# Altium footprint library 3M THD.PcbLib: 163 footprints (part 6 of 14)
Each footprint in its own frame and in the unit in brackets; x right, y up, seen from the top. Pads: shape width x height; smd on the part's side, far side on the other; paste and mask are expansions set on the pad; w line width, h text height; cw(c..) or ccw(c..) is an arc to the next point about the centre after c.
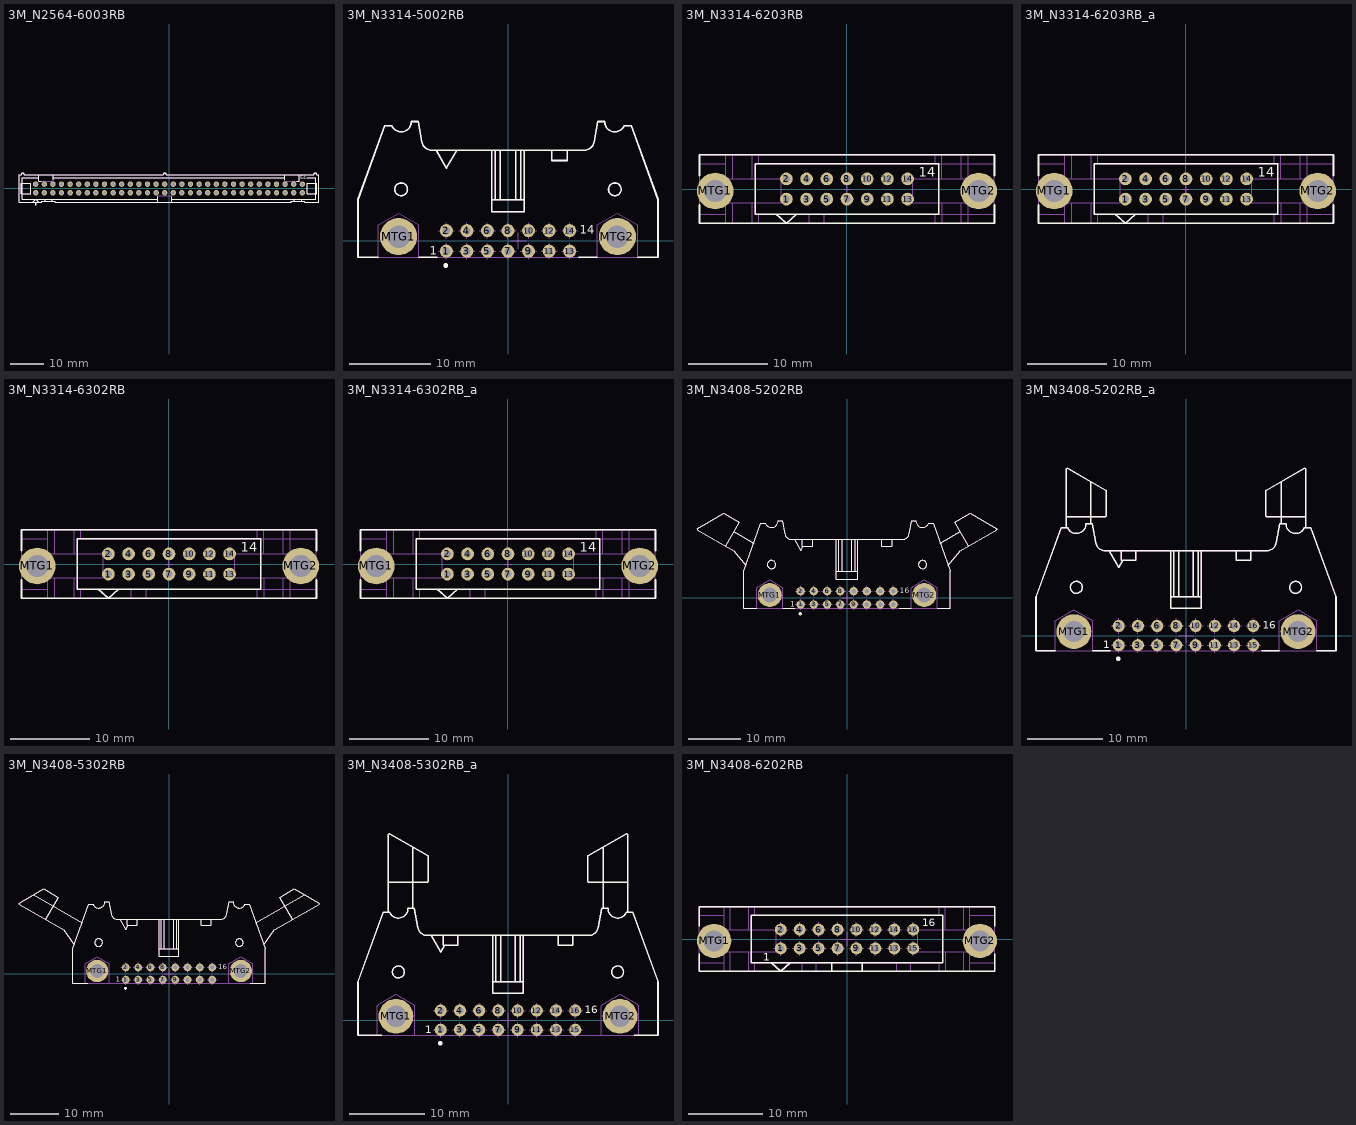
[diagram p5: the footprints below, top view; thin cyan lines are the x and y axes]

## 3M_N2564-6003RB [mm] "64 Contacts - Straight .100\" x .100\" Low Profile Four-Wall Header"
height 9.91
pads (64):
  round 1.6 hole 1: 1(-39.37,-1.27) 2(-39.37,1.27) 3(-36.83,-1.27) 4(-36.83,1.27) 5(-34.29,-1.27) 6(-34.29,1.27) 7(-31.75,-1.27) 8(-31.75,1.27) 9(-29.21,-1.27) 10(-29.21,1.27) 11(-26.67,-1.27) 12(-26.67,1.27) 13(-24.13,-1.27) 14(-24.13,1.27) 15(-21.59,-1.27) 16(-21.59,1.27) 17(-19.05,-1.27) 18(-19.05,1.27) 19(-16.51,-1.27) 20(-16.51,1.27) 21(-13.97,-1.27) 22(-13.97,1.27) 23(-11.43,-1.27) 24(-11.43,1.27) 25(-8.89,-1.27) 26(-8.89,1.27) 27(-6.35,-1.27) 28(-6.35,1.27) 29(-3.81,-1.27) 30(-3.81,1.27) 31(-1.27,-1.27) 32(-1.27,1.27) 33(1.27,-1.27) 34(1.27,1.27) 35(3.81,-1.27) 36(3.81,1.27) 37(6.35,-1.27) 38(6.35,1.27) 39(8.89,-1.27) 40(8.89,1.27) 41(11.43,-1.27) 42(11.43,1.27) 43(13.97,-1.27) 44(13.97,1.27) 45(16.51,-1.27) 46(16.51,1.27) 47(19.05,-1.27) 48(19.05,1.27) 49(21.59,-1.27) 50(21.59,1.27) 51(24.13,-1.27) 52(24.13,1.27) 53(26.67,-1.27) 54(26.67,1.27) 55(29.21,-1.27) 56(29.21,1.27) 57(31.75,-1.27) 58(31.75,1.27) 59(34.29,-1.27) 60(34.29,1.27) 61(36.83,-1.27) 62(36.83,1.27) 63(39.37,-1.27) 64(39.37,1.27)
Top Overlay:
  circle w0.3: c-39.37,-4.699 r0.15
  lines w0.2: -43.282,-1.603 -40.869,-1.603 -40.869,1.603 -43.282,1.603 ; -43.282,-1.524 -43.586,-1.524 -43.586,1.524 -43.282,1.524 ; -40.234,-4.064 -39.37,-3.2 -38.506,-4.064 ; -38.418,3.15 -43.282,3.15 -43.282,-3.2 -3.366,-3.2 ; -38.418,4.064 -38.418,2.159 -37.709,2.159 ; -36.601,-3.835 -36.601,-3.2 ; -34.519,-3.835 -34.519,-3.2 ; -34.227,2.518 -34.227,4.064 ; -34.227,3.15 34.227,3.15 ; -3.366,-4.064 -3.366,-2.438 ; 0.826,-4.064 0.826,-2.438 ; 0.826,-3.2 43.282,-3.2 43.282,3.15 40.64,3.15 ; 34.227,2.518 34.227,4.064 ; 37.059,-3.835 37.059,-3.2 ; 37.709,2.159 38.418,2.159 38.418,4.064 ; 39.141,-3.835 39.141,-3.2 ; 43.282,-1.603 40.869,-1.603 40.869,1.603 43.282,1.603 ; 43.282,-1.524 43.586,-1.524 43.586,1.524 43.282,1.524 ; -44.298,-4.064 -44.298,4.064 -43.637,4.064 cw(c-43.18,4.064) -42.723,4.064 -1.727,4.064 cw(c-1.27,4.064) -0.813,4.064 42.723,4.064 cw(c43.18,4.064) 43.637,4.064 44.298,4.064 44.298,-4.064 40.132,-4.064 40.132,-3.835 36.068,-3.835 36.068,-4.064 -33.528,-4.064 -33.528,-3.835 -37.592,-3.835 -37.592,-4.064 -44.298,-4.064
  text "64" at 38.735,2.667 h1.02
Mechanical 14:
  lines w0.1: -43.282,-1.603 -40.869,-1.603 -40.869,1.603 -43.282,1.603 ; -43.282,-1.524 -43.586,-1.524 -43.586,1.524 -43.282,1.524 ; -40.234,-4.064 -39.37,-3.2 -38.506,-4.064 ; -38.418,3.15 -43.282,3.15 -43.282,-3.2 -3.366,-3.2 ; -38.418,4.064 -38.418,2.159 -34.227,2.159 -34.227,4.064 ; -36.601,-3.835 -36.601,-3.2 ; -34.519,-3.835 -34.519,-3.2 ; -34.227,3.15 34.227,3.15 ; -3.366,-4.064 -3.366,-2.159 0.826,-2.159 0.826,-4.064 ; 0.826,-3.2 43.282,-3.2 43.282,3.15 40.64,3.15 ; 34.227,4.064 34.227,2.159 38.418,2.159 38.418,4.064 ; 37.059,-3.835 37.059,-3.2 ; 39.141,-3.835 39.141,-3.2 ; 43.282,-1.603 40.869,-1.603 40.869,1.603 43.282,1.603 ; 43.282,-1.524 43.586,-1.524 43.586,1.524 43.282,1.524 ; -44.298,-4.064 -44.298,4.064 -43.637,4.064 cw(c-43.18,4.064) -42.723,4.064 -1.727,4.064 cw(c-1.27,4.064) -0.813,4.064 42.723,4.064 cw(c43.18,4.064) 43.637,4.064 44.298,4.064 44.298,-4.064 40.132,-4.064 40.132,-3.835 36.068,-3.835 36.068,-4.064 -33.528,-4.064 -33.528,-3.835 -37.592,-3.835 -37.592,-4.064 -44.298,-4.064
  text "64" at 38.735,2.667 h1.02
3D body "3M_N2564-6003RB.stp": height 9.91, standoff -3.94, extent -44.297,-4.115 44.298,4.521

## 3M_N3314-5002RB [mm] "3M, 3000 Series, 14 Contacts - Pitch 2.54mm - Right Angle Four-Wall Header (Black) Without Roll Pin Latch/Ejectors"
height 8.6
pads (16):
  round 1.6 hole 0.9: 1(-7.62,-1.27) 2(-7.62,1.27) 3(-5.08,-1.27) 4(-5.08,1.27) 5(-2.54,-1.27) 6(-2.54,1.27) 7(0,-1.27) 8(0,1.27) 9(2.54,-1.27) 10(2.54,1.27) 11(5.08,-1.27) 12(5.08,1.27) 13(7.62,-1.27) 14(7.62,1.27)
  round 4.6 hole 2.8: MTG1(-13.526,0.533) MTG2(13.526,0.533)
Top Overlay:
  circle w0.2: c13.208,6.375 r0.787
  circle w0.2: c-13.208,6.375 r0.787
  circle w0.3: c-7.693,-3.048 r0.15
  lines w0.2: -16.027,-2.007 -18.542,-2.007 -18.542,5.105 -15.214,14.249 -14.372,14.249 ccw(c-13.208,14.757) -11.938,14.757 -11.096,14.757 -10.654,12.251 ccw(c-9.403,12.471) -9.403,11.201 9.403,11.201 ccw(c9.403,12.471) 10.654,12.251 11.096,14.757 11.938,14.757 ccw(c13.208,14.757) 14.372,14.249 15.214,14.249 18.542,5.105 18.542,-2.007 16.027,-2.007 ; -11.024,-2.007 -8.73,-2.007 ; -8.884,11.201 -7.614,9.002 ; -7.605,9 -6.335,11.2 ; -2.032,5.105 2.032,5.105 ; -2.032,11.201 -2.032,3.581 2.032,3.581 2.032,11.201 ; -1.587,5.105 -1.587,11.201 ; -0.953,5.105 -0.953,11.201 ; 0.953,5.105 0.953,11.201 ; 1.587,5.105 1.587,11.201 ; 5.398,11.201 5.391,9.931 7.309,9.931 7.303,11.201 ; 8.73,-2.007 11.024,-2.007
  text "1" at -9.652,-1.7 h1.02
  text "14" at 8.88,0.889 h1.02
Mechanical 8:
  lines w0.1: -14.526,0.533 -13.526,0.533 ; -13.526,-0.467 -13.526,0.533 ; -13.526,1.533 -13.526,0.533 ; -12.526,0.533 -13.526,0.533 ; -8.62,-1.27 -7.62,-1.27 ; -8.62,1.27 -7.62,1.27 ; -7.62,-2.27 -7.62,-1.27 ; -7.62,-0.27 -7.62,-1.27 ; -7.62,0.27 -7.62,1.27 ; -7.62,2.27 -7.62,1.27 ; -6.62,-1.27 -7.62,-1.27 ; -6.62,1.27 -7.62,1.27 ; -6.08,-1.27 -5.08,-1.27 ; -6.08,1.27 -5.08,1.27 ; -5.08,-2.27 -5.08,-1.27 ; -5.08,-0.27 -5.08,-1.27 ; -5.08,0.27 -5.08,1.27 ; -5.08,2.27 -5.08,1.27 ; -4.08,-1.27 -5.08,-1.27 ; -4.08,1.27 -5.08,1.27 ; -3.54,-1.27 -2.54,-1.27 ; -3.54,1.27 -2.54,1.27 ; -2.54,-2.27 -2.54,-1.27 ; -2.54,-0.27 -2.54,-1.27 ; -2.54,0.27 -2.54,1.27 ; -2.54,2.27 -2.54,1.27 ; -1.54,-1.27 -2.54,-1.27 ; -1.54,1.27 -2.54,1.27 ; -1,-1.27 0,-1.27 ; -1,1.27 0,1.27 ; 0,-2.27 0,-1.27 ; 0,-0.27 0,-1.27 ; 0,0.27 0,1.27 ; 0,2.27 0,1.27 ; 0.27,0 1.27,0 ; 1,-1.27 0,-1.27 ; 1,1.27 0,1.27 ; 1.27,-1 1.27,0 ; 1.27,1 1.27,0 ; 1.54,-1.27 2.54,-1.27 ; 1.54,1.27 2.54,1.27 ; 2.27,0 1.27,0 ; 2.54,-2.27 2.54,-1.27 ; 2.54,-0.27 2.54,-1.27 ; 2.54,0.27 2.54,1.27 ; 2.54,2.27 2.54,1.27 ; 3.54,-1.27 2.54,-1.27 ; 3.54,1.27 2.54,1.27 ; 4.08,-1.27 5.08,-1.27 ; 4.08,1.27 5.08,1.27 ; 5.08,-2.27 5.08,-1.27 ; 5.08,-0.27 5.08,-1.27 ; 5.08,0.27 5.08,1.27 ; 5.08,2.27 5.08,1.27 ; 6.08,-1.27 5.08,-1.27 ; 6.08,1.27 5.08,1.27 ; 6.62,-1.27 7.62,-1.27 ; 6.62,1.27 7.62,1.27 ; 7.62,-2.27 7.62,-1.27 ; 7.62,-0.27 7.62,-1.27 ; 7.62,0.27 7.62,1.27 ; 7.62,2.27 7.62,1.27 ; 8.62,-1.27 7.62,-1.27 ; 8.62,1.27 7.62,1.27 ; 12.526,0.533 13.526,0.533 ; 13.526,-0.467 13.526,0.533 ; 13.526,1.533 13.526,0.533 ; 14.526,0.533 13.526,0.533
Mechanical 14:
  circle w0.1: c-13.526,0.533 r1.27
  circle w0.1: c13.526,0.533 r1.27
  circle w0.1: c13.208,6.375 r0.787
  circle w0.1: c-13.208,6.375 r0.787
  lines w0.1: -16.027,-2.007 -16.027,1.978 -13.526,3.422 -11.024,1.978 -11.024,-2.007 ; -8.884,11.201 -7.614,9.002 -6.344,11.201 ; -2.032,5.105 2.032,5.105 ; -2.032,11.201 -2.032,3.581 2.032,3.581 2.032,11.201 ; -1.587,5.105 -1.587,11.201 ; -0.953,5.105 -0.953,11.201 ; 0.953,5.105 0.953,11.201 ; 1.587,5.105 1.587,11.201 ; 5.398,11.201 5.391,9.931 7.309,9.931 7.303,11.201 ; 11.024,-2.007 11.024,1.978 13.526,3.422 16.027,1.978 16.027,-2.007 ; -18.542,-2.007 18.542,-2.007 18.542,5.105 15.214,14.249 14.372,14.249 cw(c13.208,14.757) 11.938,14.757 11.096,14.757 10.654,12.251 cw(c9.403,12.471) 9.403,11.201 -9.403,11.201 cw(c-9.403,12.471) -10.654,12.251 -11.096,14.757 -11.938,14.757 cw(c-13.208,14.757) -14.372,14.249 -15.214,14.249 -18.542,5.105 -18.542,-2.007
  text "1" at -9.652,-1.7 h1.02
  text "14" at 8.88,0.889 h1.02
3D body "3M_N3314-5002RB.stp": height 8.64, standoff -2.84, extent -18.542,-2.514 18.542,14.758

## 3M_N3314-6203RB [mm] "14 Contacts - Straight .100'' x .100'' Low Profile Black Four-Wall Header (Short Roll Pin Latch/Ejectors), (Solder Tail 3.94mm), 3000 Series"
height 24.6
pads (16):
  round 1.6 hole 0.9: 1(-7.62,-1.27) 2(-7.62,1.27) 3(-5.08,-1.27) 4(-5.08,1.27) 5(-2.54,-1.27) 6(-2.54,1.27) 7(0,-1.27) 8(0,1.27) 9(2.54,-1.27) 10(2.54,1.27) 11(5.08,-1.27) 12(5.08,1.27) 13(7.62,-1.27) 14(7.62,1.27)
  round 4.6 hole 2.8: MTG1(-16.56,-0.25) MTG2(16.56,-0.25)
Top Overlay:
  lines w0.2: -18.542,-2 -18.542,-4.318 18.542,-4.318 18.542,-2 ; -18.542,1.7 -18.542,4.3 ; -18.542,4.318 18.542,4.318 ; 18.542,1.7 18.542,4.3 ; -11.557,-3.175 11.557,-3.175 11.557,3.175 -11.557,3.175 -11.557,-3.175 ; -8.89,-3.175 -6.35,-3.175 -7.62,-4.318 -8.89,-3.175
  text "14" at 9.05,1.525 h1.2
Mechanical 8:
  lines w0.1: -17.06,-0.25 -16.56,-0.25 ; -16.56,-0.75 -16.56,-0.25 ; -16.56,0.25 -16.56,-0.25 ; -16.06,-0.25 -16.56,-0.25 ; -8.12,-1.27 -7.62,-1.27 ; -8.12,1.27 -7.62,1.27 ; -7.62,-1.77 -7.62,-1.27 ; -7.62,-0.77 -7.62,-1.27 ; -7.62,0.77 -7.62,1.27 ; -7.62,1.77 -7.62,1.27 ; -7.12,-1.27 -7.62,-1.27 ; -7.12,1.27 -7.62,1.27 ; -5.58,-1.27 -5.08,-1.27 ; -5.58,1.27 -5.08,1.27 ; -5.08,-1.77 -5.08,-1.27 ; -5.08,-0.77 -5.08,-1.27 ; -5.08,0.77 -5.08,1.27 ; -5.08,1.77 -5.08,1.27 ; -4.58,-1.27 -5.08,-1.27 ; -4.58,1.27 -5.08,1.27 ; -3.04,-1.27 -2.54,-1.27 ; -3.04,1.27 -2.54,1.27 ; -2.54,-1.77 -2.54,-1.27 ; -2.54,-0.77 -2.54,-1.27 ; -2.54,0.77 -2.54,1.27 ; -2.54,1.77 -2.54,1.27 ; -2.04,-1.27 -2.54,-1.27 ; -2.04,1.27 -2.54,1.27 ; -0.5,-1.27 0,-1.27 ; -0.5,0 0,0 ; -0.5,1.27 0,1.27 ; 0,-1.77 0,-1.27 ; 0,-0.77 0,-1.27 ; 0,-0.5 0,0 ; 0,0.5 0,0 ; 0,0.77 0,1.27 ; 0,1.77 0,1.27 ; 0.5,-1.27 0,-1.27 ; 0.5,0 0,0 ; 0.5,1.27 0,1.27 ; 2.04,-1.27 2.54,-1.27 ; 2.04,1.27 2.54,1.27 ; 2.54,-1.77 2.54,-1.27 ; 2.54,-0.77 2.54,-1.27 ; 2.54,0.77 2.54,1.27 ; 2.54,1.77 2.54,1.27 ; 3.04,-1.27 2.54,-1.27 ; 3.04,1.27 2.54,1.27 ; 4.58,-1.27 5.08,-1.27 ; 4.58,1.27 5.08,1.27 ; 5.08,-1.77 5.08,-1.27 ; 5.08,-0.77 5.08,-1.27 ; 5.08,0.77 5.08,1.27 ; 5.08,1.77 5.08,1.27 ; 5.58,-1.27 5.08,-1.27 ; 5.58,1.27 5.08,1.27 ; 7.12,-1.27 7.62,-1.27 ; 7.12,1.27 7.62,1.27 ; 7.62,-1.77 7.62,-1.27 ; 7.62,-0.77 7.62,-1.27 ; 7.62,0.77 7.62,1.27 ; 7.62,1.77 7.62,1.27 ; 8.12,-1.27 7.62,-1.27 ; 8.12,1.27 7.62,1.27 ; 16.06,-0.25 16.56,-0.25 ; 16.56,-0.75 16.56,-0.25 ; 16.56,0.25 16.56,-0.25 ; 17.06,-0.25 16.56,-0.25
Mechanical 14:
  circle w0.1: c16.574,-0.254 r1.27
  circle w0.1: c-16.573,-0.254 r1.27
  lines w0.1: -18.542,-3.175 -15.214,-3.175 ; -15.214,-4.318 -15.214,-1.727 -8.255,-1.727 -8.255,1.27 -15.214,1.27 -15.214,4.318 ; -14.372,-4.318 -14.372,-1.727 ; -14.372,1.27 -14.372,4.318 ; -11.939,-4.318 -11.938,-1.727 ; -11.557,-1.727 -11.557,-3.175 18.542,-3.175 15.214,-3.175 ; -11.557,1.27 -11.557,3.175 18.542,3.175 15.214,3.175 ; -4.769,-4.318 -4.769,-3.175 ; -2.851,-4.318 -2.851,-3.175 ; 11.096,-4.318 11.096,-3.175 ; 11.096,3.175 11.096,4.318 ; 11.557,-3.175 11.557,-1.727 ; 11.557,1.27 11.557,3.175 ; 11.938,1.27 11.938,4.318 ; 11.979,-4.318 11.979,-1.727 ; 14.372,-4.318 14.372,-1.727 ; 14.372,1.27 14.372,4.318 ; 15.214,-4.318 15.214,-1.727 8.255,-1.727 8.255,1.27 15.214,1.27 15.214,4.318 ; -18.542,-4.318 -18.542,4.318 18.542,4.318 18.542,-4.318 -18.542,-4.318 ; -18.542,3.175 -15.214,3.175 -18.542,3.175 ; -18.097,-1.134 -16.573,-2.014 -15.049,-1.134 -15.049,0.626 -16.573,1.506 -18.097,0.626 -18.097,-1.134 ; -11.938,1.27 -11.938,4.318 -11.938,1.27 ; -11.096,-4.318 -11.096,-3.175 -11.096,-4.318 ; -11.096,3.175 -11.096,4.318 -11.096,3.175 ; -8.89,-3.175 -6.35,-3.175 -7.62,-4.318 -8.89,-3.175 ; 15.05,-1.134 16.574,-2.014 18.098,-1.134 18.098,0.626 16.574,1.506 15.05,0.626 15.05,-1.134
  text "14" at 9.05,1.525 h1.2
3D body "3M_N3314-6203RB.stp": height 18.69, standoff -3.94, extent -27.471,-4.318 27.471,4.318

## 3M_N3314-6203RB_a [mm] "14 Contacts - Straight .100'' x .100'' Low Profile Black Four-Wall Header (Short Roll Pin Latch/Ejectors), (Solder Tail 3.94mm), 3000 Series"
height 24.6
pads (16):
  round 1.6 hole 0.9: 1(-7.62,-1.27) 2(-7.62,1.27) 3(-5.08,-1.27) 4(-5.08,1.27) 5(-2.54,-1.27) 6(-2.54,1.27) 7(0,-1.27) 8(0,1.27) 9(2.54,-1.27) 10(2.54,1.27) 11(5.08,-1.27) 12(5.08,1.27) 13(7.62,-1.27) 14(7.62,1.27)
  round 4.6 hole 2.8: MTG1(-16.56,-0.25) MTG2(16.56,-0.25)
Top Overlay:
  lines w0.2: -18.542,-2 -18.542,-4.318 18.542,-4.318 18.542,-2 ; -18.542,1.7 -18.542,4.3 ; -18.542,4.318 18.542,4.318 ; 18.542,1.7 18.542,4.3 ; -11.557,-3.175 -11.557,3.175 11.557,3.175 11.557,-3.175 -11.557,-3.175 ; -8.89,-3.175 -7.62,-4.318 -6.35,-3.175 -8.89,-3.175
  text "14" at 9.05,1.525 h1.2
Mechanical 8:
  lines w0.1: -17.06,-0.25 -16.56,-0.25 ; -16.56,-0.75 -16.56,-0.25 ; -16.56,0.25 -16.56,-0.25 ; -16.06,-0.25 -16.56,-0.25 ; -8.12,-1.27 -7.62,-1.27 ; -8.12,1.27 -7.62,1.27 ; -7.62,-1.77 -7.62,-1.27 ; -7.62,-0.77 -7.62,-1.27 ; -7.62,0.77 -7.62,1.27 ; -7.62,1.77 -7.62,1.27 ; -7.12,-1.27 -7.62,-1.27 ; -7.12,1.27 -7.62,1.27 ; -5.58,-1.27 -5.08,-1.27 ; -5.58,1.27 -5.08,1.27 ; -5.08,-1.77 -5.08,-1.27 ; -5.08,-0.77 -5.08,-1.27 ; -5.08,0.77 -5.08,1.27 ; -5.08,1.77 -5.08,1.27 ; -4.58,-1.27 -5.08,-1.27 ; -4.58,1.27 -5.08,1.27 ; -3.04,-1.27 -2.54,-1.27 ; -3.04,1.27 -2.54,1.27 ; -2.54,-1.77 -2.54,-1.27 ; -2.54,-0.77 -2.54,-1.27 ; -2.54,0.77 -2.54,1.27 ; -2.54,1.77 -2.54,1.27 ; -2.04,-1.27 -2.54,-1.27 ; -2.04,1.27 -2.54,1.27 ; -0.5,-1.27 0,-1.27 ; -0.5,0 0,0 ; -0.5,1.27 0,1.27 ; 0,-1.77 0,-1.27 ; 0,-0.77 0,-1.27 ; 0,-0.5 0,0 ; 0,0.5 0,0 ; 0,0.77 0,1.27 ; 0,1.77 0,1.27 ; 0.5,-1.27 0,-1.27 ; 0.5,0 0,0 ; 0.5,1.27 0,1.27 ; 2.04,-1.27 2.54,-1.27 ; 2.04,1.27 2.54,1.27 ; 2.54,-1.77 2.54,-1.27 ; 2.54,-0.77 2.54,-1.27 ; 2.54,0.77 2.54,1.27 ; 2.54,1.77 2.54,1.27 ; 3.04,-1.27 2.54,-1.27 ; 3.04,1.27 2.54,1.27 ; 4.58,-1.27 5.08,-1.27 ; 4.58,1.27 5.08,1.27 ; 5.08,-1.77 5.08,-1.27 ; 5.08,-0.77 5.08,-1.27 ; 5.08,0.77 5.08,1.27 ; 5.08,1.77 5.08,1.27 ; 5.58,-1.27 5.08,-1.27 ; 5.58,1.27 5.08,1.27 ; 7.12,-1.27 7.62,-1.27 ; 7.12,1.27 7.62,1.27 ; 7.62,-1.77 7.62,-1.27 ; 7.62,-0.77 7.62,-1.27 ; 7.62,0.77 7.62,1.27 ; 7.62,1.77 7.62,1.27 ; 8.12,-1.27 7.62,-1.27 ; 8.12,1.27 7.62,1.27 ; 16.06,-0.25 16.56,-0.25 ; 16.56,-0.75 16.56,-0.25 ; 16.56,0.25 16.56,-0.25 ; 17.06,-0.25 16.56,-0.25
Mechanical 14:
  circle w0.1: c-16.573,-0.254 r1.27
  circle w0.1: c16.574,-0.254 r1.27
  lines w0.1: -18.542,-3.175 -15.214,-3.175 ; -15.214,-4.318 -15.214,-1.727 -8.255,-1.727 -8.255,1.27 -15.214,1.27 -15.214,4.318 ; -14.372,-4.318 -14.372,-1.727 ; -14.372,1.27 -14.372,4.318 ; -11.939,-4.318 -11.938,-1.727 ; -11.557,-1.727 -11.557,-3.175 18.542,-3.175 15.214,-3.175 ; -11.557,1.27 -11.557,3.175 18.542,3.175 15.214,3.175 ; -4.769,-4.318 -4.769,-3.175 ; -2.851,-4.318 -2.851,-3.175 ; 11.096,-4.318 11.096,-3.175 ; 11.096,3.175 11.096,4.318 ; 11.557,-3.175 11.557,-1.727 ; 11.557,1.27 11.557,3.175 ; 11.938,1.27 11.938,4.318 ; 11.979,-4.318 11.979,-1.727 ; 14.372,-4.318 14.372,-1.727 ; 14.372,1.27 14.372,4.318 ; 15.214,-4.318 15.214,-1.727 8.255,-1.727 8.255,1.27 15.214,1.27 15.214,4.318 ; -18.542,-4.318 18.542,-4.318 18.542,4.318 -18.542,4.318 -18.542,-4.318 ; -18.542,3.175 -15.214,3.175 -18.542,3.175 ; -18.097,-1.134 -18.097,0.626 -16.573,1.506 -15.049,0.626 -15.049,-1.134 -16.573,-2.014 -18.097,-1.134 ; -11.938,1.27 -11.938,4.318 -11.938,1.27 ; -11.096,-4.318 -11.096,-3.175 -11.096,-4.318 ; -11.096,3.175 -11.096,4.318 -11.096,3.175 ; -8.89,-3.175 -7.62,-4.318 -6.35,-3.175 -8.89,-3.175 ; 15.05,-1.134 15.05,0.626 16.574,1.506 18.098,0.626 18.098,-1.134 16.574,-2.014 15.05,-1.134
  text "14" at 9.05,1.525 h1.2
3D body "3M_N3314-6203RB_a.stp": height 24.64, standoff -3.94, extent -18.542,-4.318 18.542,4.318

## 3M_N3314-6302RB [mm] "3M, 3000 Series, 14 Contacts - Pitch 2.54mm - Straight Four-Wall Header (Black) With Long Roll Pin Latch/Ejectors"
height 27.2
pads (16):
  round 1.6 hole 0.9: 1(-7.62,-1.27) 2(-7.62,1.27) 3(-5.08,-1.27) 4(-5.08,1.27) 5(-2.54,-1.27) 6(-2.54,1.27) 7(0,-1.27) 8(0,1.27) 9(2.54,-1.27) 10(2.54,1.27) 11(5.08,-1.27) 12(5.08,1.27) 13(7.62,-1.27) 14(7.62,1.27)
  round 4.6 hole 2.8: MTG1(-16.56,-0.25) MTG2(16.56,-0.25)
Top Overlay:
  lines w0.2: -18.542,-2 -18.542,-4.318 18.542,-4.318 18.542,-2 ; -18.542,1.7 -18.542,4.3 ; -18.542,4.318 18.542,4.318 ; 18.542,1.7 18.542,4.3 ; -11.557,-3.175 -11.557,3.175 11.557,3.175 11.557,-3.175 -11.557,-3.175 ; -8.89,-3.175 -7.62,-4.318 -6.35,-3.175 -8.89,-3.175
  text "14" at 9.05,1.525 h1.2
Mechanical 8:
  lines w0.1: -17.06,-0.25 -16.56,-0.25 ; -16.56,-0.75 -16.56,-0.25 ; -16.56,0.25 -16.56,-0.25 ; -16.06,-0.25 -16.56,-0.25 ; -8.12,-1.27 -7.62,-1.27 ; -8.12,1.27 -7.62,1.27 ; -7.62,-1.77 -7.62,-1.27 ; -7.62,-0.77 -7.62,-1.27 ; -7.62,0.77 -7.62,1.27 ; -7.62,1.77 -7.62,1.27 ; -7.12,-1.27 -7.62,-1.27 ; -7.12,1.27 -7.62,1.27 ; -5.58,-1.27 -5.08,-1.27 ; -5.58,1.27 -5.08,1.27 ; -5.08,-1.77 -5.08,-1.27 ; -5.08,-0.77 -5.08,-1.27 ; -5.08,0.77 -5.08,1.27 ; -5.08,1.77 -5.08,1.27 ; -4.58,-1.27 -5.08,-1.27 ; -4.58,1.27 -5.08,1.27 ; -3.04,-1.27 -2.54,-1.27 ; -3.04,1.27 -2.54,1.27 ; -2.54,-1.77 -2.54,-1.27 ; -2.54,-0.77 -2.54,-1.27 ; -2.54,0.77 -2.54,1.27 ; -2.54,1.77 -2.54,1.27 ; -2.04,-1.27 -2.54,-1.27 ; -2.04,1.27 -2.54,1.27 ; -0.5,-1.27 0,-1.27 ; -0.5,0 0,0 ; -0.5,1.27 0,1.27 ; 0,-1.77 0,-1.27 ; 0,-0.77 0,-1.27 ; 0,-0.5 0,0 ; 0,0.5 0,0 ; 0,0.77 0,1.27 ; 0,1.77 0,1.27 ; 0.5,-1.27 0,-1.27 ; 0.5,0 0,0 ; 0.5,1.27 0,1.27 ; 2.04,-1.27 2.54,-1.27 ; 2.04,1.27 2.54,1.27 ; 2.54,-1.77 2.54,-1.27 ; 2.54,-0.77 2.54,-1.27 ; 2.54,0.77 2.54,1.27 ; 2.54,1.77 2.54,1.27 ; 3.04,-1.27 2.54,-1.27 ; 3.04,1.27 2.54,1.27 ; 4.58,-1.27 5.08,-1.27 ; 4.58,1.27 5.08,1.27 ; 5.08,-1.77 5.08,-1.27 ; 5.08,-0.77 5.08,-1.27 ; 5.08,0.77 5.08,1.27 ; 5.08,1.77 5.08,1.27 ; 5.58,-1.27 5.08,-1.27 ; 5.58,1.27 5.08,1.27 ; 7.12,-1.27 7.62,-1.27 ; 7.12,1.27 7.62,1.27 ; 7.62,-1.77 7.62,-1.27 ; 7.62,-0.77 7.62,-1.27 ; 7.62,0.77 7.62,1.27 ; 7.62,1.77 7.62,1.27 ; 8.12,-1.27 7.62,-1.27 ; 8.12,1.27 7.62,1.27 ; 16.06,-0.25 16.56,-0.25 ; 16.56,-0.75 16.56,-0.25 ; 16.56,0.25 16.56,-0.25 ; 17.06,-0.25 16.56,-0.25
Mechanical 14:
  circle w0.1: c-16.573,-0.254 r1.27
  circle w0.1: c16.574,-0.254 r1.27
  lines w0.1: -18.542,-3.175 -15.214,-3.175 ; -15.214,-4.318 -15.214,-1.727 -8.255,-1.727 -8.255,1.27 -15.214,1.27 -15.214,4.318 ; -14.372,-4.318 -14.372,-1.727 ; -14.372,1.27 -14.372,4.318 ; -11.939,-4.318 -11.938,-1.727 ; -11.557,-1.727 -11.557,-3.175 18.542,-3.175 15.214,-3.175 ; -11.557,1.27 -11.557,3.175 18.542,3.175 15.214,3.175 ; -4.769,-4.318 -4.769,-3.175 ; -2.851,-4.318 -2.851,-3.175 ; 11.096,-4.318 11.096,-3.175 ; 11.096,3.175 11.096,4.318 ; 11.557,-3.175 11.557,-1.727 ; 11.557,1.27 11.557,3.175 ; 11.938,1.27 11.938,4.318 ; 11.979,-4.318 11.979,-1.727 ; 14.372,-4.318 14.372,-1.727 ; 14.372,1.27 14.372,4.318 ; 15.214,-4.318 15.214,-1.727 8.255,-1.727 8.255,1.27 15.214,1.27 15.214,4.318 ; -18.542,-4.318 18.542,-4.318 18.542,4.318 -18.542,4.318 -18.542,-4.318 ; -18.542,3.175 -15.214,3.175 -18.542,3.175 ; -18.097,-1.134 -18.097,0.626 -16.573,1.506 -15.049,0.626 -15.049,-1.134 -16.573,-2.014 -18.097,-1.134 ; -11.938,1.27 -11.938,4.318 -11.938,1.27 ; -11.096,-4.318 -11.096,-3.175 -11.096,-4.318 ; -11.096,3.175 -11.096,4.318 -11.096,3.175 ; -8.89,-3.175 -7.62,-4.318 -6.35,-3.175 -8.89,-3.175 ; 15.05,-1.134 15.05,0.626 16.574,1.506 18.098,0.626 18.098,-1.134 16.574,-2.014 15.05,-1.134
  text "14" at 9.05,1.525 h1.2
3D body "3M_N3314-6302RB.stp": height 19.96, standoff -2.84, extent -29.668,-4.318 29.669,4.318

## 3M_N3314-6302RB_a [mm] "3M, 3000 Series, 14 Contacts - Pitch 2.54mm - Straight Four-Wall Header (Black) With Long Roll Pin Latch/Ejectors"
height 27.2
pads (16):
  round 1.6 hole 0.9: 1(-7.62,-1.27) 2(-7.62,1.27) 3(-5.08,-1.27) 4(-5.08,1.27) 5(-2.54,-1.27) 6(-2.54,1.27) 7(0,-1.27) 8(0,1.27) 9(2.54,-1.27) 10(2.54,1.27) 11(5.08,-1.27) 12(5.08,1.27) 13(7.62,-1.27) 14(7.62,1.27)
  round 4.6 hole 2.8: MTG1(-16.56,-0.25) MTG2(16.56,-0.25)
Top Overlay:
  lines w0.2: -18.542,-2 -18.542,-4.318 18.542,-4.318 18.542,-2 ; -18.542,1.7 -18.542,4.3 ; -18.542,4.318 18.542,4.318 ; 18.542,1.7 18.542,4.3 ; -11.557,-3.175 -11.557,3.175 11.557,3.175 11.557,-3.175 -11.557,-3.175 ; -8.89,-3.175 -7.62,-4.318 -6.35,-3.175 -8.89,-3.175
  text "14" at 9.05,1.525 h1.2
Mechanical 8:
  lines w0.1: -17.06,-0.25 -16.56,-0.25 ; -16.56,-0.75 -16.56,-0.25 ; -16.56,0.25 -16.56,-0.25 ; -16.06,-0.25 -16.56,-0.25 ; -8.12,-1.27 -7.62,-1.27 ; -8.12,1.27 -7.62,1.27 ; -7.62,-1.77 -7.62,-1.27 ; -7.62,-0.77 -7.62,-1.27 ; -7.62,0.77 -7.62,1.27 ; -7.62,1.77 -7.62,1.27 ; -7.12,-1.27 -7.62,-1.27 ; -7.12,1.27 -7.62,1.27 ; -5.58,-1.27 -5.08,-1.27 ; -5.58,1.27 -5.08,1.27 ; -5.08,-1.77 -5.08,-1.27 ; -5.08,-0.77 -5.08,-1.27 ; -5.08,0.77 -5.08,1.27 ; -5.08,1.77 -5.08,1.27 ; -4.58,-1.27 -5.08,-1.27 ; -4.58,1.27 -5.08,1.27 ; -3.04,-1.27 -2.54,-1.27 ; -3.04,1.27 -2.54,1.27 ; -2.54,-1.77 -2.54,-1.27 ; -2.54,-0.77 -2.54,-1.27 ; -2.54,0.77 -2.54,1.27 ; -2.54,1.77 -2.54,1.27 ; -2.04,-1.27 -2.54,-1.27 ; -2.04,1.27 -2.54,1.27 ; -0.5,-1.27 0,-1.27 ; -0.5,0 0,0 ; -0.5,1.27 0,1.27 ; 0,-1.77 0,-1.27 ; 0,-0.77 0,-1.27 ; 0,-0.5 0,0 ; 0,0.5 0,0 ; 0,0.77 0,1.27 ; 0,1.77 0,1.27 ; 0.5,-1.27 0,-1.27 ; 0.5,0 0,0 ; 0.5,1.27 0,1.27 ; 2.04,-1.27 2.54,-1.27 ; 2.04,1.27 2.54,1.27 ; 2.54,-1.77 2.54,-1.27 ; 2.54,-0.77 2.54,-1.27 ; 2.54,0.77 2.54,1.27 ; 2.54,1.77 2.54,1.27 ; 3.04,-1.27 2.54,-1.27 ; 3.04,1.27 2.54,1.27 ; 4.58,-1.27 5.08,-1.27 ; 4.58,1.27 5.08,1.27 ; 5.08,-1.77 5.08,-1.27 ; 5.08,-0.77 5.08,-1.27 ; 5.08,0.77 5.08,1.27 ; 5.08,1.77 5.08,1.27 ; 5.58,-1.27 5.08,-1.27 ; 5.58,1.27 5.08,1.27 ; 7.12,-1.27 7.62,-1.27 ; 7.12,1.27 7.62,1.27 ; 7.62,-1.77 7.62,-1.27 ; 7.62,-0.77 7.62,-1.27 ; 7.62,0.77 7.62,1.27 ; 7.62,1.77 7.62,1.27 ; 8.12,-1.27 7.62,-1.27 ; 8.12,1.27 7.62,1.27 ; 16.06,-0.25 16.56,-0.25 ; 16.56,-0.75 16.56,-0.25 ; 16.56,0.25 16.56,-0.25 ; 17.06,-0.25 16.56,-0.25
Mechanical 14:
  circle w0.1: c-16.573,-0.254 r1.27
  circle w0.1: c16.574,-0.254 r1.27
  lines w0.1: -18.542,-3.175 -15.214,-3.175 ; -15.214,-4.318 -15.214,-1.727 -8.255,-1.727 -8.255,1.27 -15.214,1.27 -15.214,4.318 ; -14.372,-4.318 -14.372,-1.727 ; -14.372,1.27 -14.372,4.318 ; -11.939,-4.318 -11.938,-1.727 ; -11.557,-1.727 -11.557,-3.175 18.542,-3.175 15.214,-3.175 ; -11.557,1.27 -11.557,3.175 18.542,3.175 15.214,3.175 ; -4.769,-4.318 -4.769,-3.175 ; -2.851,-4.318 -2.851,-3.175 ; 11.096,-4.318 11.096,-3.175 ; 11.096,3.175 11.096,4.318 ; 11.557,-3.175 11.557,-1.727 ; 11.557,1.27 11.557,3.175 ; 11.938,1.27 11.938,4.318 ; 11.979,-4.318 11.979,-1.727 ; 14.372,-4.318 14.372,-1.727 ; 14.372,1.27 14.372,4.318 ; 15.214,-4.318 15.214,-1.727 8.255,-1.727 8.255,1.27 15.214,1.27 15.214,4.318 ; -18.542,-4.318 18.542,-4.318 18.542,4.318 -18.542,4.318 -18.542,-4.318 ; -18.542,3.175 -15.214,3.175 -18.542,3.175 ; -18.097,-1.134 -18.097,0.626 -16.573,1.506 -15.049,0.626 -15.049,-1.134 -16.573,-2.014 -18.097,-1.134 ; -11.938,1.27 -11.938,4.318 -11.938,1.27 ; -11.096,-4.318 -11.096,-3.175 -11.096,-4.318 ; -11.096,3.175 -11.096,4.318 -11.096,3.175 ; -8.89,-3.175 -7.62,-4.318 -6.35,-3.175 -8.89,-3.175 ; 15.05,-1.134 15.05,0.626 16.574,1.506 18.098,0.626 18.098,-1.134 16.574,-2.014 15.05,-1.134